# Altium footprint library 我的元件库01.PcbLib: 321 footprints (part 7 of 21)
Each footprint in its own frame and in the unit in brackets; x right, y up, seen from the top. Pads: shape width x height; smd on the part's side, far side on the other; paste and mask are expansions set on the pad; w line width, h text height; cw(c..) or ccw(c..) is an arc to the next point about the centre after c.
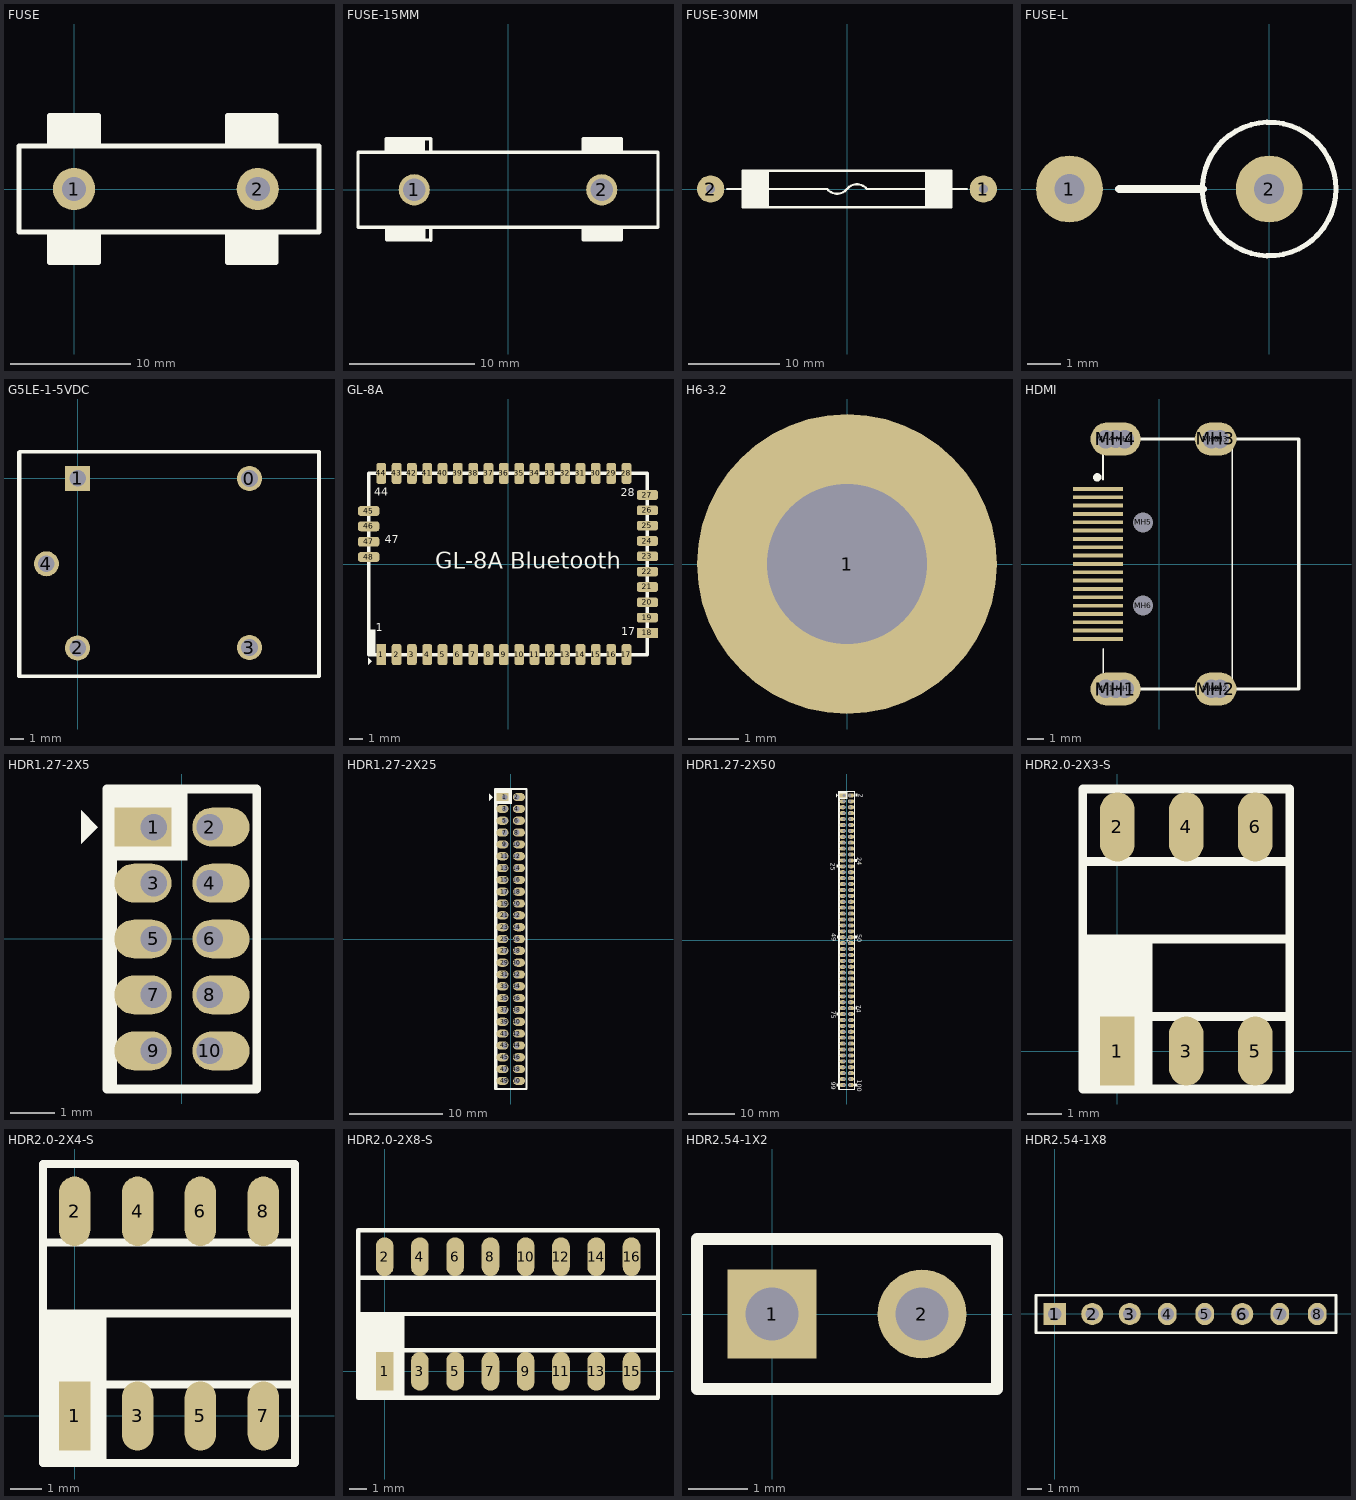
[diagram p6: the footprints below, top view; thin cyan lines are the x and y axes]

## FUSE [mm]
pads (2):
  round 3.5 hole 2: 1(0,0) 2(15.24,0)
Top Overlay:
  rectangle: -2.032,3.556 2.032,6.096
  rectangle: 12.7,3.556 16.764,6.096
  rectangle: -2.032,-6.096 2.032,-3.556
  rectangle: 12.7,-6.096 16.764,-3.556
  lines w0.4: -2.032,-3.556 -2.032,-6.096 2.032,-6.096 2.032,-3.556 ; -2.032,3.556 -2.032,6.096 2.032,6.096 2.032,3.556 ; 12.7,-3.556 12.7,-6.096 16.764,-6.096 16.764,-3.556 ; 12.7,3.556 12.7,6.096 16.764,6.096 16.764,4.064 16.764,3.556 ; -4.572,-3.556 -4.572,-2.54 -4.572,2.54 -4.572,3.556 20.32,3.556 20.32,-3.556 -4.572,-3.556
3D body "SW3dPS-ZHL30.STEP": height 10.5, standoff -2.87, extent -4.301,-4.674 20.099,4.726
3D body "SW3dPS-Fuse Small 1A.STEP": height 8.55, standoff 3.45, extent -2.152,-2.311 17.548,2.789

## FUSE-15MM [mm]
height 6
pads (2):
  round 2.5 hole 1.8: 1(-7.5,0) 2(7.5,0)
Top Overlay:
  rectangle: -9.666,-3.94 -6.618,-2.911
  rectangle: -9.679,3.137 -6.631,4.166
  rectangle: 6.069,-4.013 9.117,-2.984
  rectangle: 6.006,3.048 9.054,4.077
  lines w0.254: -9.742,3.061 -9.742,4.077 -6.186,4.077 -6.186,3.061 ; -9.728,-3 -9.728,-4.016 -6.172,-4.016 ; -6.186,-4.039 -6.186,-3.023 ; 6.006,-2.997 6.006,-4.013 9.054,-4.013 ; 6.006,3.048 6.006,4.077 9.054,4.077 9.054,3.048 ; 9.054,-4.026 9.054,-3.023 ; -12,-3 -12,3 12,3 12,-3 -12,-3
3D body "SW3dPS-ZHL30.STEP": height 10.5, standoff -2.87, extent -12.251,-4.75 12.149,4.65
3D body "SW3dPS-Fuse Small 1A.STEP": height 8.55, standoff 3.45, extent -9.373,-2.489 10.327,2.611

## FUSE-30MM [mm]
height 10
pads (2):
  round 3 hole 1: 1(15,0) 2(-15,0)
Top Overlay:
  region: 11.5,2 8.579,2 8.579,-2.025 11.5,-2.025
  rectangle: -11.5,-2.025 -8.579,2
  lines w0.254: -13.208,0 -11.684,0 ; -11.176,0 -2.179,0 ; -2.179,-0.007 ccw(c-1.092,0.889) 0,0 cw(c1.092,-0.889) 2.179,0.007 ; 2.179,0 3.607,0 ; 3.529,0.004 10.668,0 ; 11.684,0 13.208,0 ; -11.5,-2 11.5,-2 11.5,2 -11.5,2 -11.5,-2
3D body "User Library-FUSIVEL.STEP": height 5, standoff 0, extent -10.262,-2.515 9.738,2.485

## FUSE-L [mil]
height 511.81
pads (2):
  round 79 hole 35.43: 1(-236.22,0) 2(0,0)
Top Overlay:
  circle w6: c0,0 r79
  lines w10: -177.17,0 -78.74,0
3D body "保险.STEP": height 545.04, standoff -77.66, extent -249.02,-74.21 77.68,83.27

## G5LE-1-5VDC [mm]
pads (5):
  round 1.8 hole 1.2: 0(12.349,-0.016) 2(0,-12.192) 3(12.349,-12.16) 4(-2.247,-6.144)
  rect 1.8x1.8 hole 1.2: 1(0,0)
Top Overlay:
  lines w0.254: -4.213,1.88 -4.213,-14.24 17.349,-14.24 ; -4.167,-14.15 -4.167,1.926 17.349,1.926 ; -3.987,1.926 17.349,1.926 ; 17.349,-14.24 17.349,1.926 ; 17.349,-14.24 17.349,1.926
3D body "User Library-10A12V.STEP": height 16, standoff -2, extent -3.277,-13.995 15.723,1.505

## GL-8A [mm]
height 1
pads (48):
  rect 0.7x1.524 smd: 1(-9.1,-6.5)
  rrect50% 0.7x1.524 smd: 2(-8,-6.5) 3(-6.9,-6.5) 4(-5.8,-6.5) 5(-4.7,-6.5) 6(-3.6,-6.5) 7(-2.5,-6.5) 8(-1.4,-6.5) 9(-0.3,-6.5) 10(0.8,-6.5) 11(1.9,-6.5) 12(3,-6.5) 13(4.1,-6.5) 14(5.2,-6.5) 15(6.3,-6.5) 16(7.4,-6.5) 17(8.5,-6.5) 28(8.5,6.5) 29(7.4,6.5) 30(6.3,6.5) 31(5.2,6.5) 32(4.1,6.5) 33(3,6.5) 34(1.9,6.5) 35(0.8,6.5) 36(-0.3,6.5) 37(-1.4,6.5) 38(-2.5,6.5) 39(-3.6,6.5) 40(-4.7,6.5) 41(-5.8,6.5) 42(-6.9,6.5) 43(-8,6.5) 44(-9.1,6.5)
  rect 1.524x0.7 smd: 18(10,-4.95)
  rrect50% 1.524x0.7 smd: 19(10,-3.85) 20(10,-2.75) 21(10,-1.65) 22(10,-0.55) 23(10,0.55) 24(10,1.65) 25(10,2.75) 26(10,3.85) 27(10,4.95) 45(-10,3.8) 46(-10,2.7) 47(-10,1.6) 48(-10,0.5)
Top Overlay:
  region: -10.102,-4.699 -10.102,-6.606 -9.525,-6.606 -9.525,-4.699
  region: -10.033,-6.731 -9.779,-6.985 -10.033,-7.239
  lines w0.254: -10,-6.5 -10,6.5 10,6.5 10,-6.5 -10,-6.5
  text "17" at 8.128,-5.334 h1
  text "1" at -9.5,-5.029 h1
  text "28" at 8.103,4.648 h1
  text "44" at -9.601,4.699 h1
  text "47" at -8.865,1.27 h1
  text "GL-8A Bluetooth" at -5.207,-0.737 h2

## H6-3.2 [mm]
pads (1):
  round 6 hole 3.2: 1(0,0)

## HDMI [mm]
pads (33):
  rect 3x0.23 smd: 1(-3.656,4.5) 2(-3.656,4) 3(-3.656,3.5) 4(-3.656,3) 5(-3.656,2.5) 6(-3.656,2) 7(-3.656,1.5) 8(-3.656,1) 9(-3.656,0.5) 10(-3.656,0) 11(-3.656,-0.5) 12(-3.656,-1) 13(-3.656,-1.5) 14(-3.656,-2) 15(-3.656,-2.5) 16(-3.656,-3) 17(-3.656,-3.5) 18(-3.656,-4) 19(-3.656,-4.5)
  round 1.1 hole 1.1: MH1(-3.202,-7.493) MH1(-2.059,-7.493) MH2(3.148,-7.493) MH2(3.656,-7.493) MH3(3.148,7.493) MH3(3.656,7.493) MH4(-3.202,7.493) MH4(-2.059,7.493)
  oval 3x2 hole 1.1: MH1(-2.606,-7.5) MH4(-2.606,7.5)
  oval 2.5x2 hole 1: MH2(3.394,-7.5) MH3(3.394,7.5)
  round 1.1 hole 1.2: MH5(-0.956,2.5) MH6(-0.956,-2.5)
Top Overlay:
  circle w0.25: c-3.706,5.2 r0.125
  lines w0.1: -3.356,-5.08 -3.356,-7.5 3.894,-7.5 ; -3.356,5.073 -3.356,7.493 ; -3.213,7.5 4.037,7.5 ; 4.394,-7.5 4.394,7.5 ; 8.394,-7.5 8.394,7.5
  lines w0.2: -1.256,-7.5 3.894,-7.5 ; -1.256,7.5 3.394,7.5 ; 3.783,-7.5 8.394,-7.5 8.394,7.5 4.545,7.5
Mechanical 1:
  lines w0.1: -3.106,-8.05 cw(c-3.106,-7.5) -3.106,-6.95 -2.106,-6.95 cw(c-2.106,-7.5) -2.106,-8.05 -3.106,-8.05 ; -3.106,6.95 cw(c-3.106,7.5) -3.106,8.05 -2.106,8.05 cw(c-2.106,7.5) -2.106,6.95 -3.106,6.95 ; 3.148,-8.05 cw(c3.148,-7.5) 3.148,-6.95 3.656,-6.95 cw(c3.656,-7.5) 3.656,-8.05 3.148,-8.05 ; 3.148,6.95 cw(c3.148,7.5) 3.148,8.05 3.656,8.05 cw(c3.656,7.5) 3.656,6.95 3.148,6.95
3D body "User Library-10029449-001LF.STEP": height 5.98, standoff -2.02, extent -3.505,-8.354 6.395,7.846

## HDR1.27-2X5 [mm]
pads (10):
  rect 1.3x0.88 hole 0.6 copper offset -0.25,0: 1(-0.635,2.54)
  oval 1.3x0.88 hole 0.6 copper offset 0.25,0: 2(0.635,2.54) 4(0.635,1.27) 6(0.635,0) 8(0.635,-1.27) 10(0.635,-2.54)
  oval 1.3x0.88 hole 0.6 copper offset -0.25,0: 3(-0.635,1.27) 5(-0.635,0) 7(-0.635,-1.27) 9(-0.635,-2.54)
Top Overlay:
  rectangle: -1.5,1.778 0.127,3.405
  region: -2.286,2.921 -2.286,2.159 -1.905,2.54
  lines w0.2: -1.573,-3.405 -1.573,3.405 ; -1.7,-3.405 1.7,-3.405 1.7,3.405 -1.7,3.405 -1.7,-3.405
Bottom Overlay:
  rectangle: -1.5,1.778 0.127,3.405
  region: -2.286,2.921 -2.286,2.159 -1.905,2.54
  lines w0.2: -1.573,-3.405 -1.573,3.405 ; -1.7,-3.405 1.7,-3.405 1.7,3.405 -1.7,3.405 -1.7,-3.405
3D body "SW3dPS-TFM-105-11-X-D.STEP": height 7.37, standoff -2.25, extent -2.819,-4.788 2.897,4.737

## HDR1.27-2X25 [mm]
pads (50):
  rect 1.3x0.88 hole 0.6 copper offset -0.25,0: 1(-0.635,15.24)
  oval 1.3x0.88 hole 0.6 copper offset 0.25,0: 2(0.635,15.24) 4(0.635,13.97) 6(0.635,12.7) 8(0.635,11.43) 10(0.635,10.16) 12(0.635,8.89) 14(0.635,7.62) 16(0.635,6.35) 18(0.635,5.08) 20(0.635,3.81) 22(0.635,2.54) 24(0.635,1.27) 26(0.635,0) 28(0.635,-1.27) 30(0.635,-2.54) 32(0.635,-3.81) 34(0.635,-5.08) 36(0.635,-6.35) 38(0.635,-7.62) 40(0.635,-8.89) 42(0.635,-10.16) 44(0.635,-11.43) 46(0.635,-12.7) 48(0.635,-13.97) 50(0.635,-15.24)
  oval 1.3x0.88 hole 0.6 copper offset -0.25,0: 3(-0.635,13.97) 5(-0.635,12.7) 7(-0.635,11.43) 9(-0.635,10.16) 11(-0.635,8.89) 13(-0.635,7.62) 15(-0.635,6.35) 17(-0.635,5.08) 19(-0.635,3.81) 21(-0.635,2.54) 23(-0.635,1.27) 25(-0.635,0) 27(-0.635,-1.27) 29(-0.635,-2.54) 31(-0.635,-3.81) 33(-0.635,-5.08) 35(-0.635,-6.35) 37(-0.635,-7.62) 39(-0.635,-8.89) 41(-0.635,-10.16) 43(-0.635,-11.43) 45(-0.635,-12.7) 47(-0.635,-13.97) 49(-0.635,-15.24)
Top Overlay:
  rectangle: -1.5,14.478 0.127,16.105
  region: -2.286,15.621 -2.286,14.859 -1.905,15.24
  lines w0.2: -1.5,-16.105 -1.5,16.105 ; -1.7,-16.105 -1.7,16.105 1.7,16.105 1.7,-16.105 -1.7,-16.105

## HDR1.27-2X50 [mm]
pads (100):
  rect 1.3x0.88 hole 0.6 copper offset -0.25,0: 1(-0.635,31.115)
  oval 1.3x0.88 hole 0.6 copper offset 0.25,0: 2(0.635,31.115) 4(0.635,29.845) 6(0.635,28.575) 8(0.635,27.305) 10(0.635,26.035) 12(0.635,24.765) 14(0.635,23.495) 16(0.635,22.225) 18(0.635,20.955) 20(0.635,19.685) 22(0.635,18.415) 24(0.635,17.145) 26(0.635,15.875) 28(0.635,14.605) 30(0.635,13.335) 32(0.635,12.065) 34(0.635,10.795) 36(0.635,9.525) 38(0.635,8.255) 40(0.635,6.985) 42(0.635,5.715) 44(0.635,4.445) 46(0.635,3.175) 48(0.635,1.905) 50(0.635,0.635) 52(0.635,-0.635) 54(0.635,-1.905) 56(0.635,-3.175) 58(0.635,-4.445) 60(0.635,-5.715) 62(0.635,-6.985) 64(0.635,-8.255) 66(0.635,-9.525) 68(0.635,-10.795) 70(0.635,-12.065) 72(0.635,-13.335) 74(0.635,-14.605) 76(0.635,-15.875) 78(0.635,-17.145) 80(0.635,-18.415) 82(0.635,-19.685) 84(0.635,-20.955) 86(0.635,-22.225) 88(0.635,-23.495) 90(0.635,-24.765) 92(0.635,-26.035) 94(0.635,-27.305) 96(0.635,-28.575) 98(0.635,-29.845) 100(0.635,-31.115)
  oval 1.3x0.88 hole 0.6 copper offset -0.25,0: 3(-0.635,29.845) 5(-0.635,28.575) 7(-0.635,27.305) 9(-0.635,26.035) 11(-0.635,24.765) 13(-0.635,23.495) 15(-0.635,22.225) 17(-0.635,20.955) 19(-0.635,19.685) 21(-0.635,18.415) 23(-0.635,17.145) 25(-0.635,15.875) 27(-0.635,14.605) 29(-0.635,13.335) 31(-0.635,12.065) 33(-0.635,10.795) 35(-0.635,9.525) 37(-0.635,8.255) 39(-0.635,6.985) 41(-0.635,5.715) 43(-0.635,4.445) 45(-0.635,3.175) 47(-0.635,1.905) 49(-0.635,0.635) 51(-0.635,-0.635) 53(-0.635,-1.905) 55(-0.635,-3.175) 57(-0.635,-4.445) 59(-0.635,-5.715) 61(-0.635,-6.985) 63(-0.635,-8.255) 65(-0.635,-9.525) 67(-0.635,-10.795) 69(-0.635,-12.065) 71(-0.635,-13.335) 73(-0.635,-14.605) 75(-0.635,-15.875) 77(-0.635,-17.145) 79(-0.635,-18.415) 81(-0.635,-19.685) 83(-0.635,-20.955) 85(-0.635,-22.225) 87(-0.635,-23.495) 89(-0.635,-24.765) 91(-0.635,-26.035) 93(-0.635,-27.305) 95(-0.635,-28.575) 97(-0.635,-29.845) 99(-0.635,-31.115)
Top Overlay:
  rectangle: -1.5,30.353 0.127,31.98
  rectangle: 1.88,30.861 2.261,31.496
  rectangle: -2.261,15.596 -1.88,16.231
  rectangle: 1.753,16.815 2.184,17.45
  rectangle: 1.753,0.33 2.134,0.965
  rectangle: -2.108,0.33 -1.727,0.965
  rectangle: 1.829,-14.935 2.21,-14.3
  rectangle: -2.21,-16.205 -1.829,-15.57
  rectangle: 1.778,-31.445 2.159,-30.81
  rectangle: -2.21,-31.471 -1.829,-30.836
  region: -2.286,31.496 -2.286,30.734 -1.905,31.115
  lines w0.2: -1.524,-31.877 -1.524,31.877 ; -1.7,-31.98 1.7,-31.98 1.7,31.98 -1.7,31.98 -1.7,-31.98
  text "+" at -0.33,-0.508 h1
  text "2" at 2.515,31.496 h1
  text "100" at 2.261,-29.947 h1
  text "99" at -3.302,-30.429 h1
  text "50" at 2.235,1.295 h1
  text "49" at -3.277,1.524 h1
  text "24" at 2.261,17.831 h1
  text "25" at -3.454,16.612 h1
  text "74" at 2.108,-13.843 h1
  text "75" at -3.404,-15.138 h1
Bottom Overlay:
  rectangle: -1.5,30.353 0.127,31.98
  region: -2.286,31.496 -2.286,30.734 -1.905,31.115
  lines w0.2: -1.524,-31.877 -1.524,31.877 ; -1.7,-31.98 1.7,-31.98 1.7,31.98 -1.7,31.98 -1.7,-31.98

## HDR2.0-2X3-S [mm]
pads (6):
  rect 1x2 smd: 1(0,0)
  oval 1x2 smd: 2(0,6.5) 3(2,0) 4(2,6.5) 5(4,0) 6(4,6.5)
Top Overlay:
  rectangle: -1.016,-1.067 1.016,3.251
  lines w0.254: -1,1 5,1 ; -1,3.25 5,3.25 ; -1,5.5 5,5.5 ; -1,-1.1 -1,7.6 5,7.6 5,-1.1 -1,-1.1
3D body "SW3dPS-MOLEX_87340-0622.STEP": height 2.29, standoff 0.14, extent -1.044,0.225 4.956,6.325

## HDR2.0-2X4-S [mm]
pads (8):
  rect 1x2.2 smd: 1(0,0)
  oval 1x2.2 smd: 2(0,6.5) 3(2,0) 4(2,6.5) 5(4,0) 6(4,6.5) 7(6,0) 8(6,6.5)
Top Overlay:
  rectangle: -1.016,-1.524 1.016,3.251
  lines w0.254: -1,1 7,1 ; -1,3.25 7,3.25 ; -1,5.5 7,5.5 ; -1,-1.5 -1,8 7,8 7,-1.5 -1,-1.5

## HDR2.0-2X8-S [mm]
pads (16):
  rect 1x2.2 smd: 1(0,0)
  oval 1x2.2 smd: 2(0,6.5) 3(2,0) 4(2,6.5) 5(4,0) 6(4,6.5) 7(6,0) 8(6,6.5) 9(8,0) 10(8,6.5) 11(10,0) 12(10,6.5) 13(12,0) 14(12,6.5) 15(14,0) 16(14,6.5)
Top Overlay:
  rectangle: -1.509,-1.5 1.133,3.25
  lines w0.254: -1.5,1.2 15.5,1.2 ; -1.5,3.25 15.5,3.25 ; -1.5,5.3 15.5,5.3 ; -1.5,-1.5 15.5,-1.5 15.5,8 -1.5,8 -1.5,-1.5

## HDR2.54-1X2 [mm] "两针跳线（已加焊）"
pads (2):
  rect 1.5x1.5 hole 0.9: 1(0,0)
  round 1.5 hole 0.9: 2(2.54,0)
Top Overlay:
  lines w0.2: -1.27,-1.27 3.81,-1.27 3.81,1.27 -1.27,1.27 -1.27,-1.27
3D body "HDR1X2_Y.stp": height 8.68, standoff -3, extent -1.27,-1.265 3.81,1.275

## HDR2.54-1X8 [mm] "Connector; Header; 8 Position"
pads (8):
  rect 1.5x1.5 hole 0.9: 1(0,0)
  round 1.5 hole 0.9: 2(2.54,0) 3(5.08,0) 6(12.7,0)
  oval 1.27x1.5 hole 0.9: 4(7.62,0) 5(10.16,0) 7(15.24,0) 8(17.78,0)
Top Overlay:
  lines w0.2: -1.27,-1.27 19.05,-1.27 19.05,1.27 -1.27,1.27 -1.27,-1.27
3D body "8 pin strip.STEP": height 0.7, standoff -10.9, extent -1.27,-1.27 19.05,1.27